# Altium footprint library ST封装.PcbLib: 1336 footprints (part 92 of 109) (continued)
## SQFP44X44-576(N) [mm] (continued)
  oval 0.2x1.6 smd: 145(1.25,-44.15) 146(1.55,-44.15) 147(1.85,-44.15) 148(2.15,-44.15) 149(2.45,-44.15) 150(2.75,-44.15) 151(3.05,-44.15) 152(3.35,-44.15) 153(3.65,-44.15) 154(3.95,-44.15) 155(4.25,-44.15) 156(4.55,-44.15) 157(4.85,-44.15) 158(5.15,-44.15) 159(5.45,-44.15) 160(5.75,-44.15) 161(6.05,-44.15) 162(6.35,-44.15) 163(6.65,-44.15) 164(6.95,-44.15) 165(7.25,-44.15) 166(7.55,-44.15) 167(7.85,-44.15) 168(8.15,-44.15) 169(8.45,-44.15) 170(8.75,-44.15) 171(9.05,-44.15) 172(9.35,-44.15) 173(9.65,-44.15) 174(9.95,-44.15) 175(10.25,-44.15) 176(10.55,-44.15) 177(10.85,-44.15) 178(11.15,-44.15) 179(11.45,-44.15) 180(11.75,-44.15) 181(12.05,-44.15) 182(12.35,-44.15) 183(12.65,-44.15) 184(12.95,-44.15) 185(13.25,-44.15) 186(13.55,-44.15) 187(13.85,-44.15) 188(14.15,-44.15) 189(14.45,-44.15) 190(14.75,-44.15) 191(15.05,-44.15) 192(15.35,-44.15) 193(15.65,-44.15) 194(15.95,-44.15) 195(16.25,-44.15) 196(16.55,-44.15) 197(16.85,-44.15) 198(17.15,-44.15) 199(17.45,-44.15) 200(17.75,-44.15) 201(18.05,-44.15) 202(18.35,-44.15) 203(18.65,-44.15) 204(18.95,-44.15) 205(19.25,-44.15) 206(19.55,-44.15) 207(19.85,-44.15) 208(20.15,-44.15) 209(20.45,-44.15) 210(20.75,-44.15) 211(21.05,-44.15) 212(21.35,-44.15) 213(21.65,-44.15) 214(21.95,-44.15) 215(22.25,-44.15) 216(22.55,-44.15) 217(22.85,-44.15) 218(23.15,-44.15) 219(23.45,-44.15) 220(23.75,-44.15) 221(24.05,-44.15) 222(24.35,-44.15) 223(24.65,-44.15) 224(24.95,-44.15) 225(25.25,-44.15) 226(25.55,-44.15) 227(25.85,-44.15) 228(26.15,-44.15) 229(26.45,-44.15) 230(26.75,-44.15) 231(27.05,-44.15) 232(27.35,-44.15) 233(27.65,-44.15) 234(27.95,-44.15) 235(28.25,-44.15) 236(28.55,-44.15) 237(28.85,-44.15) 238(29.15,-44.15) 239(29.45,-44.15) 240(29.75,-44.15) 241(30.05,-44.15) 242(30.35,-44.15) 243(30.65,-44.15) 244(30.95,-44.15) 245(31.25,-44.15) 246(31.55,-44.15) 247(31.85,-44.15) 248(32.15,-44.15) 249(32.45,-44.15) 250(32.75,-44.15) 251(33.05,-44.15) 252(33.35,-44.15) 253(33.65,-44.15) 254(33.95,-44.15) 255(34.25,-44.15) 256(34.55,-44.15) 257(34.85,-44.15) 258(35.15,-44.15) 259(35.45,-44.15) 260(35.75,-44.15) 261(36.05,-44.15) 262(36.35,-44.15) 263(36.65,-44.15) 264(36.95,-44.15) 265(37.25,-44.15) 266(37.55,-44.15) 267(37.85,-44.15) 268(38.15,-44.15) 269(38.45,-44.15) 270(38.75,-44.15) 271(39.05,-44.15) 272(39.35,-44.15) 273(39.65,-44.15) 274(39.95,-44.15) 275(40.25,-44.15) 276(40.55,-44.15) 277(40.85,-44.15) 278(41.15,-44.15) 279(41.45,-44.15) 280(41.75,-44.15) 281(42.05,-44.15) 282(42.35,-44.15) 283(42.65,-44.15) 284(42.95,-44.15) 285(43.25,-44.15) 286(43.55,-44.15) 287(43.85,-44.15) 288(44.15,-44.15) 433(44.15,1.25) 434(43.85,1.25) 435(43.55,1.25) 436(43.25,1.25) 437(42.95,1.25) 438(42.65,1.25) 439(42.35,1.25) 440(42.05,1.25) 441(41.75,1.25) 442(41.45,1.25) 443(41.15,1.25) 444(40.85,1.25) 445(40.55,1.25) 446(40.25,1.25) 447(39.95,1.25) 448(39.65,1.25) 449(39.35,1.25) 450(39.05,1.25) 451(38.75,1.25) 452(38.45,1.25) 453(38.15,1.25) 454(37.85,1.25) 455(37.55,1.25) 456(37.25,1.25) 457(36.95,1.25) 458(36.65,1.25) 459(36.35,1.25) 460(36.05,1.25) 461(35.75,1.25) 462(35.45,1.25) 463(35.15,1.25) 464(34.85,1.25) 465(34.55,1.25) 466(34.25,1.25) 467(33.95,1.25) 468(33.65,1.25) 469(33.35,1.25) 470(33.05,1.25) 471(32.75,1.25) 472(32.45,1.25) 473(32.15,1.25) 474(31.85,1.25) 475(31.55,1.25) 476(31.25,1.25) 477(30.95,1.25) 478(30.65,1.25) 479(30.35,1.25) 480(30.05,1.25) 481(29.75,1.25) 482(29.45,1.25) 483(29.15,1.25) 484(28.85,1.25) 485(28.55,1.25) 486(28.25,1.25) 487(27.95,1.25) 488(27.65,1.25) 489(27.35,1.25) 490(27.05,1.25) 491(26.75,1.25) 492(26.45,1.25) 493(26.15,1.25) 494(25.85,1.25) 495(25.55,1.25) 496(25.25,1.25) 497(24.95,1.25) 498(24.65,1.25) 499(24.35,1.25) 500(24.05,1.25) 501(23.75,1.25) 502(23.45,1.25) 503(23.15,1.25) 504(22.85,1.25) 505(22.55,1.25) 506(22.25,1.25) 507(21.95,1.25) 508(21.65,1.25) 509(21.35,1.25) 510(21.05,1.25) 511(20.75,1.25) 512(20.45,1.25) 513(20.15,1.25) 514(19.85,1.25) 515(19.55,1.25) 516(19.25,1.25) 517(18.95,1.25) 518(18.65,1.25) 519(18.35,1.25) 520(18.05,1.25) 521(17.75,1.25) 522(17.45,1.25) 523(17.15,1.25) 524(16.85,1.25) 525(16.55,1.25) 526(16.25,1.25) 527(15.95,1.25) 528(15.65,1.25) 529(15.35,1.25) 530(15.05,1.25) 531(14.75,1.25) 532(14.45,1.25) 533(14.15,1.25) 534(13.85,1.25) 535(13.55,1.25) 536(13.25,1.25) 537(12.95,1.25) 538(12.65,1.25) 539(12.35,1.25) 540(12.05,1.25) 541(11.75,1.25) 542(11.45,1.25) 543(11.15,1.25) 544(10.85,1.25) 545(10.55,1.25) 546(10.25,1.25) 547(9.95,1.25) 548(9.65,1.25) 549(9.35,1.25) 550(9.05,1.25) 551(8.75,1.25) 552(8.45,1.25) 553(8.15,1.25) 554(7.85,1.25) 555(7.55,1.25) 556(7.25,1.25) 557(6.95,1.25) 558(6.65,1.25) 559(6.35,1.25) 560(6.05,1.25) 561(5.75,1.25) 562(5.45,1.25) 563(5.15,1.25) 564(4.85,1.25) 565(4.55,1.25) 566(4.25,1.25) 567(3.95,1.25) 568(3.65,1.25) 569(3.35,1.25) 570(3.05,1.25) 571(2.75,1.25) 572(2.45,1.25) 573(2.15,1.25) 574(1.85,1.25) 575(1.55,1.25) 576(1.25,1.25)
Top Overlay:
  lines w0.2: -0.4,-43.5 -0.4,-44.55 0.65,-44.55 ; -0.4,0.6 -0.4,0.85 0.4,1.65 0.65,1.65 ; 44.75,-44.55 45.8,-44.55 45.8,-43.5 ; 44.75,1.65 45.8,1.65 45.8,0.6

## SQFP44X44-576(T) [mm]
pads (576):
  rect 0.2x1.6 smd: 1(0,0)
  oval 0.2x1.6 smd: 2(-0.3,0) 3(-0.6,0) 4(-0.9,0) 5(-1.2,0) 6(-1.5,0) 7(-1.8,0) 8(-2.1,0) 9(-2.4,0) 10(-2.7,0) 11(-3,0) 12(-3.3,0) 13(-3.6,0) 14(-3.9,0) 15(-4.2,0) 16(-4.5,0) 17(-4.8,0) 18(-5.1,0) 19(-5.4,0) 20(-5.7,0) 21(-6,0) 22(-6.3,0) 23(-6.6,0) 24(-6.9,0) 25(-7.2,0) 26(-7.5,0) 27(-7.8,0) 28(-8.1,0) 29(-8.4,0) 30(-8.7,0) 31(-9,0) 32(-9.3,0) 33(-9.6,0) 34(-9.9,0) 35(-10.2,0) 36(-10.5,0) 37(-10.8,0) 38(-11.1,0) 39(-11.4,0) 40(-11.7,0) 41(-12,0) 42(-12.3,0) 43(-12.6,0) 44(-12.9,0) 45(-13.2,0) 46(-13.5,0) 47(-13.8,0) 48(-14.1,0) 49(-14.4,0) 50(-14.7,0) 51(-15,0) 52(-15.3,0) 53(-15.6,0) 54(-15.9,0) 55(-16.2,0) 56(-16.5,0) 57(-16.8,0) 58(-17.1,0) 59(-17.4,0) 60(-17.7,0) 61(-18,0) 62(-18.3,0) 63(-18.6,0) 64(-18.9,0) 65(-19.2,0) 66(-19.5,0) 67(-19.8,0) 68(-20.1,0) 69(-20.4,0) 70(-20.7,0) 71(-21,0) 72(-21.3,0) 217(-21.3,-45.4) 218(-21,-45.4) 219(-20.7,-45.4) 220(-20.4,-45.4) 221(-20.1,-45.4) 222(-19.8,-45.4) 223(-19.5,-45.4) 224(-19.2,-45.4) 225(-18.9,-45.4) 226(-18.6,-45.4) 227(-18.3,-45.4) 228(-18,-45.4) 229(-17.7,-45.4) 230(-17.4,-45.4) 231(-17.1,-45.4) 232(-16.8,-45.4) 233(-16.5,-45.4) 234(-16.2,-45.4) 235(-15.9,-45.4) 236(-15.6,-45.4) 237(-15.3,-45.4) 238(-15,-45.4) 239(-14.7,-45.4) 240(-14.4,-45.4) 241(-14.1,-45.4) 242(-13.8,-45.4) 243(-13.5,-45.4) 244(-13.2,-45.4) 245(-12.9,-45.4) 246(-12.6,-45.4) 247(-12.3,-45.4) 248(-12,-45.4) 249(-11.7,-45.4) 250(-11.4,-45.4) 251(-11.1,-45.4) 252(-10.8,-45.4) 253(-10.5,-45.4) 254(-10.2,-45.4) 255(-9.9,-45.4) 256(-9.6,-45.4) 257(-9.3,-45.4) 258(-9,-45.4) 259(-8.7,-45.4) 260(-8.4,-45.4) 261(-8.1,-45.4) 262(-7.8,-45.4) 263(-7.5,-45.4) 264(-7.2,-45.4) 265(-6.9,-45.4) 266(-6.6,-45.4) 267(-6.3,-45.4) 268(-6,-45.4) 269(-5.7,-45.4) 270(-5.4,-45.4) 271(-5.1,-45.4) 272(-4.8,-45.4) 273(-4.5,-45.4) 274(-4.2,-45.4) 275(-3.9,-45.4) 276(-3.6,-45.4) 277(-3.3,-45.4) 278(-3,-45.4) 279(-2.7,-45.4) 280(-2.4,-45.4) 281(-2.1,-45.4) 282(-1.8,-45.4) 283(-1.5,-45.4) 284(-1.2,-45.4) 285(-0.9,-45.4) 286(-0.6,-45.4) 287(-0.3,-45.4) 288(0,-45.4) 289(0.3,-45.4) 290(0.6,-45.4) 291(0.9,-45.4) 292(1.2,-45.4) 293(1.5,-45.4) 294(1.8,-45.4) 295(2.1,-45.4) 296(2.4,-45.4) 297(2.7,-45.4) 298(3,-45.4) 299(3.3,-45.4) 300(3.6,-45.4) 301(3.9,-45.4) 302(4.2,-45.4) 303(4.5,-45.4) 304(4.8,-45.4) 305(5.1,-45.4) 306(5.4,-45.4) 307(5.7,-45.4) 308(6,-45.4) 309(6.3,-45.4) 310(6.6,-45.4) 311(6.9,-45.4) 312(7.2,-45.4) 313(7.5,-45.4) 314(7.8,-45.4) 315(8.1,-45.4) 316(8.4,-45.4) 317(8.7,-45.4) 318(9,-45.4) 319(9.3,-45.4) 320(9.6,-45.4) 321(9.9,-45.4) 322(10.2,-45.4) 323(10.5,-45.4) 324(10.8,-45.4) 325(11.1,-45.4) 326(11.4,-45.4) 327(11.7,-45.4) 328(12,-45.4) 329(12.3,-45.4) 330(12.6,-45.4) 331(12.9,-45.4) 332(13.2,-45.4) 333(13.5,-45.4) 334(13.8,-45.4) 335(14.1,-45.4) 336(14.4,-45.4) 337(14.7,-45.4) 338(15,-45.4) 339(15.3,-45.4) 340(15.6,-45.4) 341(15.9,-45.4) 342(16.2,-45.4) 343(16.5,-45.4) 344(16.8,-45.4) 345(17.1,-45.4) 346(17.4,-45.4) 347(17.7,-45.4) 348(18,-45.4) 349(18.3,-45.4) 350(18.6,-45.4) 351(18.9,-45.4) 352(19.2,-45.4) 353(19.5,-45.4) 354(19.8,-45.4) 355(20.1,-45.4) 356(20.4,-45.4) 357(20.7,-45.4) 358(21,-45.4) 359(21.3,-45.4) 360(21.6,-45.4) 505(21.6,0) 506(21.3,0) 507(21,0) 508(20.7,0) 509(20.4,0) 510(20.1,0) 511(19.8,0) 512(19.5,0) 513(19.2,0) 514(18.9,0) 515(18.6,0) 516(18.3,0) 517(18,0) 518(17.7,0) 519(17.4,0) 520(17.1,0) 521(16.8,0) 522(16.5,0) 523(16.2,0) 524(15.9,0) 525(15.6,0) 526(15.3,0) 527(15,0) 528(14.7,0) 529(14.4,0) 530(14.1,0) 531(13.8,0) 532(13.5,0) 533(13.2,0) 534(12.9,0) 535(12.6,0) 536(12.3,0) 537(12,0) 538(11.7,0) 539(11.4,0) 540(11.1,0) 541(10.8,0) 542(10.5,0) 543(10.2,0) 544(9.9,0) 545(9.6,0) 546(9.3,0) 547(9,0) 548(8.7,0) 549(8.4,0) 550(8.1,0) 551(7.8,0) 552(7.5,0) 553(7.2,0) 554(6.9,0) 555(6.6,0) 556(6.3,0) 557(6,0) 558(5.7,0) 559(5.4,0) 560(5.1,0) 561(4.8,0) 562(4.5,0) 563(4.2,0) 564(3.9,0) 565(3.6,0) 566(3.3,0) 567(3,0) 568(2.7,0) 569(2.4,0) 570(2.1,0) 571(1.8,0) 572(1.5,0) 573(1.2,0) 574(0.9,0) 575(0.6,0) 576(0.3,0)
  oval 1.6x0.2 smd: 73(-22.55,-1.25) 74(-22.55,-1.55) 75(-22.55,-1.85) 76(-22.55,-2.15) 77(-22.55,-2.45) 78(-22.55,-2.75) 79(-22.55,-3.05) 80(-22.55,-3.35) 81(-22.55,-3.65) 82(-22.55,-3.95) 83(-22.55,-4.25) 84(-22.55,-4.55) 85(-22.55,-4.85) 86(-22.55,-5.15) 87(-22.55,-5.45) 88(-22.55,-5.75) 89(-22.55,-6.05) 90(-22.55,-6.35) 91(-22.55,-6.65) 92(-22.55,-6.95) 93(-22.55,-7.25) 94(-22.55,-7.55) 95(-22.55,-7.85) 96(-22.55,-8.15) 97(-22.55,-8.45) 98(-22.55,-8.75) 99(-22.55,-9.05) 100(-22.55,-9.35) 101(-22.55,-9.65) 102(-22.55,-9.95) 103(-22.55,-10.25) 104(-22.55,-10.55) 105(-22.55,-10.85) 106(-22.55,-11.15) 107(-22.55,-11.45) 108(-22.55,-11.75) 109(-22.55,-12.05) 110(-22.55,-12.35) 111(-22.55,-12.65) 112(-22.55,-12.95) 113(-22.55,-13.25) 114(-22.55,-13.55) 115(-22.55,-13.85) 116(-22.55,-14.15) 117(-22.55,-14.45) 118(-22.55,-14.75) 119(-22.55,-15.05) 120(-22.55,-15.35) 121(-22.55,-15.65) 122(-22.55,-15.95) 123(-22.55,-16.25) 124(-22.55,-16.55) 125(-22.55,-16.85) 126(-22.55,-17.15) 127(-22.55,-17.45) 128(-22.55,-17.75) 129(-22.55,-18.05) 130(-22.55,-18.35) 131(-22.55,-18.65) 132(-22.55,-18.95) 133(-22.55,-19.25) 134(-22.55,-19.55) 135(-22.55,-19.85) 136(-22.55,-20.15) 137(-22.55,-20.45) 138(-22.55,-20.75) 139(-22.55,-21.05) 140(-22.55,-21.35) 141(-22.55,-21.65) 142(-22.55,-21.95) 143(-22.55,-22.25) 144(-22.55,-22.55) 145(-22.55,-22.85) 146(-22.55,-23.15) 147(-22.55,-23.45) 148(-22.55,-23.75) 149(-22.55,-24.05) 150(-22.55,-24.35) 151(-22.55,-24.65) 152(-22.55,-24.95) 153(-22.55,-25.25) 154(-22.55,-25.55) 155(-22.55,-25.85) 156(-22.55,-26.15) 157(-22.55,-26.45) 158(-22.55,-26.75) 159(-22.55,-27.05) 160(-22.55,-27.35) 161(-22.55,-27.65) 162(-22.55,-27.95) 163(-22.55,-28.25) 164(-22.55,-28.55) 165(-22.55,-28.85) 166(-22.55,-29.15) 167(-22.55,-29.45) 168(-22.55,-29.75) 169(-22.55,-30.05) 170(-22.55,-30.35) 171(-22.55,-30.65) 172(-22.55,-30.95) 173(-22.55,-31.25) 174(-22.55,-31.55) 175(-22.55,-31.85) 176(-22.55,-32.15) 177(-22.55,-32.45) 178(-22.55,-32.75) 179(-22.55,-33.05) 180(-22.55,-33.35) 181(-22.55,-33.65) 182(-22.55,-33.95) 183(-22.55,-34.25) 184(-22.55,-34.55) 185(-22.55,-34.85) 186(-22.55,-35.15) 187(-22.55,-35.45) 188(-22.55,-35.75) 189(-22.55,-36.05) 190(-22.55,-36.35) 191(-22.55,-36.65) 192(-22.55,-36.95) 193(-22.55,-37.25) 194(-22.55,-37.55) 195(-22.55,-37.85) 196(-22.55,-38.15) 197(-22.55,-38.45) 198(-22.55,-38.75) 199(-22.55,-39.05) 200(-22.55,-39.35) 201(-22.55,-39.65) 202(-22.55,-39.95) 203(-22.55,-40.25) 204(-22.55,-40.55) 205(-22.55,-40.85) 206(-22.55,-41.15) 207(-22.55,-41.45) 208(-22.55,-41.75) 209(-22.55,-42.05) 210(-22.55,-42.35) 211(-22.55,-42.65) 212(-22.55,-42.95) 213(-22.55,-43.25) 214(-22.55,-43.55) 215(-22.55,-43.85) 216(-22.55,-44.15) 361(22.85,-44.15) 362(22.85,-43.85) 363(22.85,-43.55) 364(22.85,-43.25) 365(22.85,-42.95) 366(22.85,-42.65) 367(22.85,-42.35) 368(22.85,-42.05) 369(22.85,-41.75) 370(22.85,-41.45) 371(22.85,-41.15) 372(22.85,-40.85) 373(22.85,-40.55) 374(22.85,-40.25) 375(22.85,-39.95) 376(22.85,-39.65) 377(22.85,-39.35) 378(22.85,-39.05) 379(22.85,-38.75) 380(22.85,-38.45) 381(22.85,-38.15) 382(22.85,-37.85) 383(22.85,-37.55) 384(22.85,-37.25) 385(22.85,-36.95) 386(22.85,-36.65) 387(22.85,-36.35) 388(22.85,-36.05) 389(22.85,-35.75) 390(22.85,-35.45) 391(22.85,-35.15) 392(22.85,-34.85) 393(22.85,-34.55) 394(22.85,-34.25) 395(22.85,-33.95) 396(22.85,-33.65) 397(22.85,-33.35) 398(22.85,-33.05) 399(22.85,-32.75) 400(22.85,-32.45) 401(22.85,-32.15) 402(22.85,-31.85) 403(22.85,-31.55) 404(22.85,-31.25) 405(22.85,-30.95) 406(22.85,-30.65) 407(22.85,-30.35) 408(22.85,-30.05) 409(22.85,-29.75) 410(22.85,-29.45) 411(22.85,-29.15) 412(22.85,-28.85) 413(22.85,-28.55) 414(22.85,-28.25) 415(22.85,-27.95) 416(22.85,-27.65) 417(22.85,-27.35) 418(22.85,-27.05) 419(22.85,-26.75) 420(22.85,-26.45) 421(22.85,-26.15) 422(22.85,-25.85) 423(22.85,-25.55) 424(22.85,-25.25) 425(22.85,-24.95) 426(22.85,-24.65) 427(22.85,-24.35) 428(22.85,-24.05) 429(22.85,-23.75) 430(22.85,-23.45) 431(22.85,-23.15) 432(22.85,-22.85) 433(22.85,-22.55) 434(22.85,-22.25) 435(22.85,-21.95) 436(22.85,-21.65) 437(22.85,-21.35) 438(22.85,-21.05) 439(22.85,-20.75) 440(22.85,-20.45) 441(22.85,-20.15) 442(22.85,-19.85) 443(22.85,-19.55) 444(22.85,-19.25) 445(22.85,-18.95) 446(22.85,-18.65) 447(22.85,-18.35) 448(22.85,-18.05) 449(22.85,-17.75) 450(22.85,-17.45) 451(22.85,-17.15) 452(22.85,-16.85) 453(22.85,-16.55) 454(22.85,-16.25) 455(22.85,-15.95) 456(22.85,-15.65) 457(22.85,-15.35) 458(22.85,-15.05) 459(22.85,-14.75) 460(22.85,-14.45) 461(22.85,-14.15) 462(22.85,-13.85) 463(22.85,-13.55) 464(22.85,-13.25) 465(22.85,-12.95) 466(22.85,-12.65) 467(22.85,-12.35) 468(22.85,-12.05) 469(22.85,-11.75) 470(22.85,-11.45) 471(22.85,-11.15) 472(22.85,-10.85) 473(22.85,-10.55) 474(22.85,-10.25) 475(22.85,-9.95) 476(22.85,-9.65) 477(22.85,-9.35) 478(22.85,-9.05) 479(22.85,-8.75) 480(22.85,-8.45) 481(22.85,-8.15) 482(22.85,-7.85) 483(22.85,-7.55) 484(22.85,-7.25) 485(22.85,-6.95) 486(22.85,-6.65) 487(22.85,-6.35) 488(22.85,-6.05) 489(22.85,-5.75) 490(22.85,-5.45) 491(22.85,-5.15) 492(22.85,-4.85) 493(22.85,-4.55) 494(22.85,-4.25) 495(22.85,-3.95) 496(22.85,-3.65) 497(22.85,-3.35) 498(22.85,-3.05) 499(22.85,-2.75) 500(22.85,-2.45) 501(22.85,-2.15) 502(22.85,-1.85) 503(22.85,-1.55) 504(22.85,-1.25)
Top Overlay:
  lines w0.2: -22.95,-44.75 -22.95,-45.8 -21.9,-45.8 ; -22.95,-0.65 -22.95,-0.4 -22.15,0.4 -21.9,0.4 ; 22.2,-45.8 23.25,-45.8 23.25,-44.75 ; 22.2,0.4 23.25,0.4 23.25,-0.65

## SSO48 [mm]
pads (48):
  rect 2.2x0.45 smd: 1(0,0)
  oval 2.2x0.45 smd: 2(0,-0.63) 3(0,-1.26) 4(0,-1.89) 5(0,-2.52) 6(0,-3.15) 7(0,-3.78) 8(0,-4.41) 9(0,-5.04) 10(0,-5.67) 11(0,-6.3) 12(0,-6.93) 13(0,-7.56) 14(0,-8.19) 15(0,-8.82) 16(0,-9.45) 17(0,-10.08) 18(0,-10.71) 19(0,-11.34) 20(0,-11.97) 21(0,-12.6) 22(0,-13.23) 23(0,-13.86) 24(0,-14.49) 25(9.4,-14.49) 26(9.4,-13.86) 27(9.4,-13.23) 28(9.4,-12.6) 29(9.4,-11.97) 30(9.4,-11.34) 31(9.4,-10.71) 32(9.4,-10.08) 33(9.4,-9.45) 34(9.4,-8.82) 35(9.4,-8.19) 36(9.4,-7.56) 37(9.4,-6.93) 38(9.4,-6.3) 39(9.4,-5.67) 40(9.4,-5.04) 41(9.4,-4.41) 42(9.4,-3.78) 43(9.4,-3.15) 44(9.4,-2.52) 45(9.4,-1.89) 46(9.4,-1.26) 47(9.4,-0.63) 48(9.4,0)
Top Overlay:
  lines w0.2: 0.9,-15.215 0.9,-15.545 8.5,-15.545 8.5,-15.215 ; 0.9,0.725 0.9,1.055 4.065,1.055 ccw(c4.7,1.055) 5.335,1.055 8.5,1.055 8.5,0.725

## SSO56 [mm]
pads (56):
  rect 2.2x0.45 smd: 1(0,0)
  oval 2.2x0.45 smd: 2(0,-0.63) 3(0,-1.26) 4(0,-1.89) 5(0,-2.52) 6(0,-3.15) 7(0,-3.78) 8(0,-4.41) 9(0,-5.04) 10(0,-5.67) 11(0,-6.3) 12(0,-6.93) 13(0,-7.56) 14(0,-8.19) 15(0,-8.82) 16(0,-9.45) 17(0,-10.08) 18(0,-10.71) 19(0,-11.34) 20(0,-11.97) 21(0,-12.6) 22(0,-13.23) 23(0,-13.86) 24(0,-14.49) 25(0,-15.12) 26(0,-15.75) 27(0,-16.38) 28(0,-17.01) 29(9.4,-17.01) 30(9.4,-16.38) 31(9.4,-15.75) 32(9.4,-15.12) 33(9.4,-14.49) 34(9.4,-13.86) 35(9.4,-13.23) 36(9.4,-12.6) 37(9.4,-11.97) 38(9.4,-11.34) 39(9.4,-10.71) 40(9.4,-10.08) 41(9.4,-9.45) 42(9.4,-8.82) 43(9.4,-8.19) 44(9.4,-7.56) 45(9.4,-6.93) 46(9.4,-6.3) 47(9.4,-5.67) 48(9.4,-5.04) 49(9.4,-4.41) 50(9.4,-3.78) 51(9.4,-3.15) 52(9.4,-2.52) 53(9.4,-1.89) 54(9.4,-1.26) 55(9.4,-0.63) 56(9.4,0)
Top Overlay:
  lines w0.2: 0.9,-17.735 0.9,-18.075 8.5,-18.075 8.5,-17.735 ; 0.9,0.725 0.9,1.065 4.065,1.065 ccw(c4.7,1.065) 5.335,1.065 8.5,1.065 8.5,0.725

## SSOP8 [mm]
pads (8):
  rect 2x0.35 smd: 1(0,0)
  oval 2x0.35 smd: 2(0,-0.65) 3(0,-1.3) 4(0,-1.95) 5(6.5,-1.95) 6(6.5,-1.3) 7(6.5,-0.65) 8(6.5,0)
Top Overlay:
  lines w0.15: 1.535,-2.275 1.535,0.325 3.087,0.325 ccw(c3.25,0.325) 3.413,0.325 4.965,0.325 4.965,-2.275 1.535,-2.275

## SSOP14 [mm]
pads (14):
  rect 2x0.35 smd: 1(0,0)
  oval 2x0.35 smd: 2(0,-0.635) 3(0,-1.27) 4(0,-1.905) 5(0,-2.54) 6(0,-3.175) 7(0,-3.81) 8(6.4,-3.81) 9(6.4,-3.175) 10(6.4,-2.54) 11(6.4,-1.905) 12(6.4,-1.27) 13(6.4,-0.635) 14(6.4,0)
Top Overlay:
  lines w0.2: 1.835,-4.19 1.835,0.318 3.041,0.318 ccw(c3.2,0.318) 3.359,0.317 4.565,0.318 4.565,-4.19 1.835,-4.19

## SSOP16 [mm] "SSOP, Plastic; 16 Leads; Body Width 5.3 mm; Pitch 0.65 mm"
height 2
pads (16):
  rect 0.4x2.15 smd: 1(-2.275,-3.275) 2(-1.625,-3.275) 3(-0.975,-3.275) 4(-0.325,-3.275) 5(0.325,-3.275) 6(0.975,-3.275) 7(1.625,-3.275) 8(2.275,-3.275) 9(2.275,3.275) 10(1.625,3.275) 11(0.975,3.275) 12(0.325,3.275) 13(-0.325,3.275) 14(-0.975,3.275) 15(-1.625,3.275) 16(-2.275,3.275)
Top Overlay:
  circle w0.25: c-3.025,-3.275 r0.125
  lines w0.2: -3.25,-1.8 3.25,-1.8 3.25,1.8 -3.25,1.8 -3.25,0.6 cw(c-3.25,0) -3.25,-0.6 -3.25,-1.8
3D body "SSOP-16.STEP": height 1.1, standoff 0, extent -2.489,-2.743 2.489,3.251

## SSOP20 [mm] "SSOP, Plastic; 20 Leads; Body Width 5.3 mm; Pitch 0.65 mm"
height 2
pads (20):
  rect 0.4x2.15 smd: 1(-2.925,-3.275) 2(-2.275,-3.275) 3(-1.625,-3.275) 4(-0.975,-3.275) 5(-0.325,-3.275) 6(0.325,-3.275) 7(0.975,-3.275) 8(1.625,-3.275) 9(2.275,-3.275) 10(2.925,-3.275) 11(2.925,3.275) 12(2.275,3.275) 13(1.625,3.275) 14(0.975,3.275) 15(0.325,3.275) 16(-0.325,3.275) 17(-0.975,3.275) 18(-1.625,3.275) 19(-2.275,3.275) 20(-2.925,3.275)
Top Overlay:
  circle w0.25: c-3.675,-3.275 r0.125
  lines w0.2: -3.75,-1.8 -3.75,-0.6 ccw(c-3.75,0) -3.75,0.6 -3.75,1.8 3.75,1.8 3.75,-1.8 -3.75,-1.8
3D body "SSOP-20.STEP": height 1.78, standoff -0.21, extent -3.665,-3.823 3.665,4.077

## SSOP24 [mm]
pads (24):
  rect 2x0.22 smd: 1(0,0)
  oval 2x0.22 smd: 2(0,-0.66) 3(0,-1.32) 4(0,-1.98) 5(0,-2.64) 6(0,-3.3) 7(0,-3.96) 8(0,-4.62) 9(0,-5.28) 10(0,-5.94) 11(0,-6.6) 12(0,-7.26) 13(7.5,-7.26) 14(7.5,-6.6) 15(7.5,-5.94) 16(7.5,-5.28) 17(7.5,-4.62) 18(7.5,-3.96) 19(7.5,-3.3) 20(7.5,-2.64) 21(7.5,-1.98) 22(7.5,-1.32) 23(7.5,-0.66) 24(7.5,0)
Top Overlay:
  lines w0.2: 1.835,-7.59 1.835,0.33 3.585,0.33 ccw(c3.75,0.33) 3.915,0.33 5.665,0.33 5.665,-7.59 1.835,-7.59

## SSOP24_L [mil]
pads (24):
  rect 14x80 smd: 1(0,0) 2(25.59,0) 3(51.18,0) 4(76.77,0) 5(102.36,0) 6(127.95,0) 7(153.54,0) 8(179.13,0) 9(204.72,0) 10(230.31,0) 11(255.91,0) 12(281.5,0) 13(281.5,281.89) 14(255.91,281.89) 15(230.31,281.89) 16(204.72,281.89) 17(179.13,281.89) 18(153.54,281.89) 19(127.95,281.89) 20(102.36,281.89) 21(76.77,281.89) 22(51.18,281.89) 23(25.59,281.89) 24(0,281.89)
Top Overlay:
  lines w10: -26.38,167.72 -26.38,333.86 310.63,333.86 310.63,-55.51 -25.59,-55.51 -25.59,118.31 2.26,146.16 -26.38,167.72

## SSOP28 [mm] "SSOP; 28 Leads; Body Width 3.9 mm; Pitch 0.635 mm"
height 1.75
pads (28):
  rect 0.4x2 smd: 1(-4.127,-2.575) 2(-3.492,-2.575) 3(-2.857,-2.575) 4(-2.222,-2.575) 5(-1.587,-2.575) 6(-0.953,-2.575) 7(-0.318,-2.575) 8(0.318,-2.575) 9(0.953,-2.575) 10(1.587,-2.575) 11(2.222,-2.575) 12(2.857,-2.575) 13(3.492,-2.575) 14(4.127,-2.575) 15(4.127,2.575) 16(3.492,2.575) 17(2.857,2.575) 18(2.222,2.575) 19(1.587,2.575) 20(0.953,2.575) 21(0.318,2.575) 22(-0.318,2.575) 23(-0.953,2.575) 24(-1.587,2.575) 25(-2.222,2.575) 26(-2.857,2.575) 27(-3.492,2.575) 28(-4.127,2.575)
Top Overlay:
  circle w0.25: c-4.878,-2.575 r0.125
  lines w0.2: -5,-1.175 -5,-0.392 ccw(c-5,0) -5,0.392 -5,1.175 5,1.175 5,-1.175 -5,-1.175
3D body "TSSOP-28.STEP": height 1.02, standoff 0.03, extent -4.85,-3.2 4.85,3.2

## SSOP28W [mm] "SSOP, Plastic; 28 Leads; Body Width 5.3 mm; Pitch 0.65 mm"
height 2
pads (28):
  rect 0.4x2.05 smd: 1(-4.225,-3.4) 2(-3.575,-3.4) 3(-2.925,-3.4) 4(-2.275,-3.4) 5(-1.625,-3.4) 6(-0.975,-3.4) 7(-0.325,-3.4) 8(0.325,-3.4) 9(0.975,-3.4) 10(1.625,-3.4) 11(2.275,-3.4) 12(2.925,-3.4) 13(3.575,-3.4) 14(4.225,-3.4) 15(4.225,3.4) 16(3.575,3.4) 17(2.925,3.4) 18(2.275,3.4) 19(1.625,3.4) 20(0.975,3.4) 21(0.325,3.4) 22(-0.325,3.4) 23(-0.975,3.4) 24(-1.625,3.4) 25(-2.275,3.4) 26(-2.925,3.4) 27(-3.575,3.4) 28(-4.225,3.4)
Top Overlay:
  circle w0.25: c-4.975,-3.4 r0.125
  lines w0.2: -5.175,-1.975 -5.175,-0.658 ccw(c-5.175,0) -5.175,0.658 -5.175,1.975 5.175,1.975 5.175,-1.975 -5.175,-1.975
3D body "TSSOP-28.STEP": height 1.02, standoff 0.03, extent -4.85,-3.073 4.85,3.327

## SSOP30 [mm] "SSOP, Plastic; 28 Leads; Body Width 5.3 mm; Pitch 0.65 mm"
height 2
pads (30):
  rect 2.05x0.4 smd: 1(-3.4,4.55) 2(-3.4,3.9) 3(-3.4,3.25) 4(-3.4,2.6) 5(-3.4,1.95) 6(-3.4,1.3) 7(-3.4,0.65) 8(-3.4,0) 9(-3.4,-0.65) 10(-3.4,-1.3) 11(-3.4,-1.95) 12(-3.4,-2.6) 13(-3.4,-3.25) 14(-3.4,-3.9) 15(-3.4,-4.55) 16(3.4,-4.55) 17(3.4,-3.9) 18(3.4,-3.25) 19(3.4,-2.6) 20(3.4,-1.95) 21(3.4,-1.3) 22(3.4,-0.65) 23(3.4,0) 24(3.4,0.65) 25(3.4,1.3) 26(3.4,1.95) 27(3.4,2.6) 28(3.4,3.25) 29(3.4,3.9) 30(3.4,4.55)
Top Overlay:
  circle w0.25: c-3.4,5.3 r0.125
  lines w0.2: -1.975,-4.85 -1.975,5.5 -0.658,5.5 ccw(c0,5.5) 0.658,5.5 1.975,5.5 1.975,-4.85 -1.975,-4.85
3D body "SSOP-30.STEP": height 1, standoff 0, extent -4.054,-4.85 4.054,4.85

## SSOP48 [mm] "SOP, 48-Leads, Body 16.2x9.4mm (max), Pitch 0.63mm, IPC Medium Density"
height 2.769
pads (48):
  oval 1.9x0.35 smd mask+0: 1(-4.75,7.302) 2(-4.75,6.667) 3(-4.75,6.032) 4(-4.75,5.397) 5(-4.75,4.763) 6(-4.75,4.127) 7(-4.75,3.492) 8(-4.75,2.857) 9(-4.75,2.222) 10(-4.75,1.587) 11(-4.75,0.953) 12(-4.75,0.318) 13(-4.75,-0.318) 14(-4.75,-0.953) 15(-4.75,-1.587) 16(-4.75,-2.222) 17(-4.75,-2.857) 18(-4.75,-3.492) 19(-4.75,-4.127) 20(-4.75,-4.763) 21(-4.75,-5.397) 22(-4.75,-6.032) 23(-4.75,-6.667) 24(-4.75,-7.302) 25(4.75,-7.302) 26(4.75,-6.667) 27(4.75,-6.032) 28(4.75,-5.397) 29(4.75,-4.763) 30(4.75,-4.127) 31(4.75,-3.492) 32(4.75,-2.857) 33(4.75,-2.222) 34(4.75,-1.587) 35(4.75,-0.953) 36(4.75,-0.318) 37(4.75,0.318) 38(4.75,0.953) 39(4.75,1.587) 40(4.75,2.222) 41(4.75,2.857) 42(4.75,3.492) 43(4.75,4.127) 44(4.75,4.763) 45(4.75,5.397) 46(4.75,6.032) 47(4.75,6.667) 48(4.75,7.302)
Top Overlay:
  circle w0.6: c-2.4,7.1 r0.3
  circle w0.25: c-4.75,8.027 r0.125
  lines w0.2: -3.4,-8.1 3.4,-8.1 3.4,8.1 -3.4,8.1 -3.4,-8.1
3D body "User Library-SSOP48.STEP": height 2.65, standoff 0, extent -5.175,-7.999 5.225,8.001